# Altium schematic symbol library jlcpcb_2025_04_capacitors_extended_0603.schlib: 3668 symbols (part 12 of 20) (continued)
## CGA3E2C0G1H330JT0Y0N
designator C?  Capacitance: 33pF  (hidden comment: *)
Capacitor, Ceramic (MLCC), 33pF, ±5%, 50V, C0G, ±5%, SMD 0603; Manufacturer: TDK; Manufacturer Part Number: CGA3E2C0G1H330JT0Y0N; Package Size: 0603; JLCPCB Basic Part: No; JLCPCB Part Number: C342894; Supplier 1: LCSC; Category: Capacitors - MLCC; Supplier Part Number 1: C342894; Tolerance: ±5%; Voltage Rating: 50V; Temperature Coefficient: C0G; RoHS: Yes; ComponentLink1Description: Datasheet; ComponentLink1URL: https://wmsc.lcsc.com/wmsc/upload/file/pdf/v2/lcsc/2304140030_TDK-CGA3E2C0G1H330JT0Y0N_C342894.pdf; ComponentLink2Description: JLCPCB Part URL; ComponentLink2URL: https://jlcpcb.com/partdetail/C342894; ComponentLink3Description: LCSC Part URL; ComponentLink3URL: https://lcsc.com/product-detail/Multilayer-Ceramic-Capacitors-MLCC---SMD-SMT_TDK-TDK-CGA3E2C0G1H330JT0Y0N_C342894.html
footprint CAP-0603 (0603 (1608M) Capacitor)
pins: 1, 2

## CGA3E2C0G1H331JT0Y0N
designator C?  Capacitance: 330pF  (hidden comment: *)
Capacitor, Ceramic (MLCC), 330pF, ±5%, 50V, C0G, ±5%, SMD 0603; Manufacturer: TDK; Manufacturer Part Number: CGA3E2C0G1H331JT0Y0N; Package Size: 0603; JLCPCB Basic Part: No; JLCPCB Part Number: C338066; Supplier 1: LCSC; Category: Capacitors - MLCC; Supplier Part Number 1: C338066; Tolerance: ±5%; Voltage Rating: 50V; Temperature Coefficient: C0G; RoHS: Yes; ComponentLink1Description: Datasheet; ComponentLink1URL: https://wmsc.lcsc.com/wmsc/upload/file/pdf/v2/lcsc/2304140030_TDK-CGA3E2C0G1H331JT0Y0N_C338066.pdf; ComponentLink2Description: JLCPCB Part URL; ComponentLink2URL: https://jlcpcb.com/partdetail/C338066; ComponentLink3Description: LCSC Part URL; ComponentLink3URL: https://lcsc.com/product-detail/Multilayer-Ceramic-Capacitors-MLCC---SMD-SMT_TDK-TDK-CGA3E2C0G1H331JT0Y0N_C338066.html
footprint CAP-0603 (0603 (1608M) Capacitor)
pins: 1, 2

## CGA3E2C0G1H332JT0Y0N
designator C?  Capacitance: 3.3nF  (hidden comment: *)
Capacitor, Ceramic (MLCC), 3.3nF, ±5%, 50V, C0G, ±5%, SMD 0603; Manufacturer: TDK; Manufacturer Part Number: CGA3E2C0G1H332JT0Y0N; Package Size: 0603; JLCPCB Basic Part: No; JLCPCB Part Number: C342822; Supplier 1: LCSC; Category: Capacitors - MLCC; Supplier Part Number 1: C342822; Tolerance: ±5%; Voltage Rating: 50V; Temperature Coefficient: C0G; RoHS: Yes; ComponentLink1Description: Datasheet; ComponentLink1URL: https://wmsc.lcsc.com/wmsc/upload/file/pdf/v2/lcsc/2304140030_TDK-CGA3E2C0G1H332JT0Y0N_C342822.pdf; ComponentLink2Description: JLCPCB Part URL; ComponentLink2URL: https://jlcpcb.com/partdetail/C342822; ComponentLink3Description: LCSC Part URL; ComponentLink3URL: https://lcsc.com/product-detail/Multilayer-Ceramic-Capacitors-MLCC---SMD-SMT_TDK-TDK-CGA3E2C0G1H332JT0Y0N_C342822.html
footprint CAP-0603 (0603 (1608M) Capacitor)
pins: 1, 2

## CGA3E2C0G1H391JT0Y0N
designator C?  Capacitance: 390pF  (hidden comment: *)
Capacitor, Ceramic (MLCC), 390pF, ±5%, 50V, C0G, ±5%, SMD 0603; Manufacturer: TDK; Manufacturer Part Number: CGA3E2C0G1H391JT0Y0N; Package Size: 0603; JLCPCB Basic Part: No; JLCPCB Part Number: C342914; Supplier 1: LCSC; Category: Capacitors - MLCC; Supplier Part Number 1: C342914; Tolerance: ±5%; Voltage Rating: 50V; Temperature Coefficient: C0G; RoHS: Yes; ComponentLink1Description: Datasheet; ComponentLink1URL: https://wmsc.lcsc.com/wmsc/upload/file/pdf/v2/lcsc/2304140030_TDK-CGA3E2C0G1H391JT0Y0N_C342914.pdf; ComponentLink2Description: JLCPCB Part URL; ComponentLink2URL: https://jlcpcb.com/partdetail/C342914; ComponentLink3Description: LCSC Part URL; ComponentLink3URL: https://lcsc.com/product-detail/Multilayer-Ceramic-Capacitors-MLCC---SMD-SMT_TDK-TDK-CGA3E2C0G1H391JT0Y0N_C342914.html
footprint CAP-0603 (0603 (1608M) Capacitor)
pins: 1, 2

## CGA3E2C0G1H470JT0Y0N
designator C?  Capacitance: 47pF  (hidden comment: *)
Capacitor, Ceramic (MLCC), 47pF, ±5%, 50V, C0G, ±5%, SMD 0603; Manufacturer: TDK; Manufacturer Part Number: CGA3E2C0G1H470JT0Y0N; Package Size: 0603; JLCPCB Basic Part: No; JLCPCB Part Number: C342895; Supplier 1: LCSC; Category: Capacitors - MLCC; Supplier Part Number 1: C342895; Tolerance: ±5%; Voltage Rating: 50V; Temperature Coefficient: C0G; RoHS: Yes; ComponentLink1Description: Datasheet; ComponentLink1URL: https://wmsc.lcsc.com/wmsc/upload/file/pdf/v2/lcsc/2304140030_TDK-CGA3E2C0G1H470JT0Y0N_C342895.pdf; ComponentLink2Description: JLCPCB Part URL; ComponentLink2URL: https://jlcpcb.com/partdetail/C342895; ComponentLink3Description: LCSC Part URL; ComponentLink3URL: https://lcsc.com/product-detail/Multilayer-Ceramic-Capacitors-MLCC---SMD-SMT_TDK-TDK-CGA3E2C0G1H470JT0Y0N_C342895.html
footprint CAP-0603 (0603 (1608M) Capacitor)
pins: 1, 2

## CGA3E2C0G1H471JT0Y0N
designator C?  Capacitance: 470pF  (hidden comment: *)
Capacitor, Ceramic (MLCC), 470pF, ±5%, 50V, C0G, ±5%, SMD 0603; Manufacturer: TDK; Manufacturer Part Number: CGA3E2C0G1H471JT0Y0N; Package Size: 0603; JLCPCB Basic Part: No; JLCPCB Part Number: C342912; Supplier 1: LCSC; Category: Capacitors - MLCC; Supplier Part Number 1: C342912; Tolerance: ±5%; Voltage Rating: 50V; Temperature Coefficient: C0G; RoHS: Yes; ComponentLink1Description: Datasheet; ComponentLink1URL: https://wmsc.lcsc.com/wmsc/upload/file/pdf/v2/lcsc/2304140030_TDK-CGA3E2C0G1H471JT0Y0N_C342912.pdf; ComponentLink2Description: JLCPCB Part URL; ComponentLink2URL: https://jlcpcb.com/partdetail/C342912; ComponentLink3Description: LCSC Part URL; ComponentLink3URL: https://lcsc.com/product-detail/Multilayer-Ceramic-Capacitors-MLCC---SMD-SMT_TDK-TDK-CGA3E2C0G1H471JT0Y0N_C342912.html
footprint CAP-0603 (0603 (1608M) Capacitor)
pins: 1, 2

## CGA3E2C0G1H472JT0Y0N
designator C?  Capacitance: 4.7nF  (hidden comment: *)
Capacitor, Ceramic (MLCC), 4.7nF, ±5%, 50V, C0G, ±5%, SMD 0603; Manufacturer: TDK; Manufacturer Part Number: CGA3E2C0G1H472JT0Y0N; Package Size: 0603; JLCPCB Basic Part: No; JLCPCB Part Number: C338071; Supplier 1: LCSC; Category: Capacitors - MLCC; Supplier Part Number 1: C338071; Tolerance: ±5%; Voltage Rating: 50V; Temperature Coefficient: C0G; RoHS: Yes; ComponentLink1Description: Datasheet; ComponentLink1URL: https://wmsc.lcsc.com/wmsc/upload/file/pdf/v2/lcsc/2304140030_TDK-CGA3E2C0G1H472JT0Y0N_C338071.pdf; ComponentLink2Description: JLCPCB Part URL; ComponentLink2URL: https://jlcpcb.com/partdetail/C338071; ComponentLink3Description: LCSC Part URL; ComponentLink3URL: https://lcsc.com/product-detail/Multilayer-Ceramic-Capacitors-MLCC---SMD-SMT_TDK-TDK-CGA3E2C0G1H472JT0Y0N_C338071.html
footprint CAP-0603 (0603 (1608M) Capacitor)
pins: 1, 2

## CGA3E2C0G1H560JT0Y0N
designator C?  Capacitance: 56pF  (hidden comment: *)
Capacitor, Ceramic (MLCC), 56pF, ±5%, 50V, C0G, ±5%, SMD 0603; Manufacturer: TDK; Manufacturer Part Number: CGA3E2C0G1H560JT0Y0N; Package Size: 0603; JLCPCB Basic Part: No; JLCPCB Part Number: C338104; Supplier 1: LCSC; Category: Capacitors - MLCC; Supplier Part Number 1: C338104; Tolerance: ±5%; Voltage Rating: 50V; Temperature Coefficient: C0G; RoHS: Yes; ComponentLink1Description: Datasheet; ComponentLink1URL: https://wmsc.lcsc.com/wmsc/upload/file/pdf/v2/lcsc/2304140030_TDK-CGA3E2C0G1H560JT0Y0N_C338104.pdf; ComponentLink2Description: JLCPCB Part URL; ComponentLink2URL: https://jlcpcb.com/partdetail/C338104; ComponentLink3Description: LCSC Part URL; ComponentLink3URL: https://lcsc.com/product-detail/Multilayer-Ceramic-Capacitors-MLCC---SMD-SMT_TDK-TDK-CGA3E2C0G1H560JT0Y0N_C338104.html
footprint CAP-0603 (0603 (1608M) Capacitor)
pins: 1, 2

## CGA3E2C0G1H561JT0Y0N
designator C?  Capacitance: 560pF  (hidden comment: *)
Capacitor, Ceramic (MLCC), 560pF, ±5%, 50V, C0G, ±5%, SMD 0603; Manufacturer: TDK; Manufacturer Part Number: CGA3E2C0G1H561JT0Y0N; Package Size: 0603; JLCPCB Basic Part: No; JLCPCB Part Number: C694498; Supplier 1: LCSC; Category: Capacitors - MLCC; Supplier Part Number 1: C694498; Tolerance: ±5%; Voltage Rating: 50V; Temperature Coefficient: C0G; RoHS: Yes; ComponentLink1Description: Datasheet; ComponentLink1URL: https://wmsc.lcsc.com/wmsc/upload/file/pdf/v2/lcsc/2304140030_TDK-CGA3E2C0G1H561JT0Y0N_C694498.pdf; ComponentLink2Description: JLCPCB Part URL; ComponentLink2URL: https://jlcpcb.com/partdetail/C694498; ComponentLink3Description: LCSC Part URL; ComponentLink3URL: https://lcsc.com/product-detail/Multilayer-Ceramic-Capacitors-MLCC---SMD-SMT_TDK-TDK-CGA3E2C0G1H561JT0Y0N_C694498.html
footprint CAP-0603 (0603 (1608M) Capacitor)
pins: 1, 2

## CGA3E2C0G1H681JT0Y0N
designator C?  Capacitance: 680pF  (hidden comment: *)
Capacitor, Ceramic (MLCC), 680pF, ±5%, 50V, C0G, ±5%, SMD 0603; Manufacturer: TDK; Manufacturer Part Number: CGA3E2C0G1H681JT0Y0N; Package Size: 0603; JLCPCB Basic Part: No; JLCPCB Part Number: C342925; Supplier 1: LCSC; Category: Capacitors - MLCC; Supplier Part Number 1: C342925; Tolerance: ±5%; Voltage Rating: 50V; Temperature Coefficient: C0G; RoHS: Yes; ComponentLink1Description: Datasheet; ComponentLink1URL: https://wmsc.lcsc.com/wmsc/upload/file/pdf/v2/lcsc/2304140030_TDK-CGA3E2C0G1H681JT0Y0N_C342925.pdf; ComponentLink2Description: JLCPCB Part URL; ComponentLink2URL: https://jlcpcb.com/partdetail/C342925; ComponentLink3Description: LCSC Part URL; ComponentLink3URL: https://lcsc.com/product-detail/Multilayer-Ceramic-Capacitors-MLCC---SMD-SMT_TDK-TDK-CGA3E2C0G1H681JT0Y0N_C342925.html
footprint CAP-0603 (0603 (1608M) Capacitor)
pins: 1, 2

## CGA3E2C0G1H682JT0Y0N
designator C?  Capacitance: 6.8nF  (hidden comment: *)
Capacitor, Ceramic (MLCC), 6.8nF, ±5%, 50V, C0G, ±5%, SMD 0603; Manufacturer: TDK; Manufacturer Part Number: CGA3E2C0G1H682JT0Y0N; Package Size: 0603; JLCPCB Basic Part: No; JLCPCB Part Number: C2835383; Supplier 1: LCSC; Category: Capacitors - MLCC; Supplier Part Number 1: C2835383; Tolerance: ±5%; Voltage Rating: 50V; Temperature Coefficient: C0G; RoHS: Yes; ComponentLink1Description: Datasheet; ComponentLink1URL: https://wmsc.lcsc.com/wmsc/upload/file/pdf/v2/lcsc/2108160930_TDK-CGA3E2C0G1H682JT0Y0N_C2835383.pdf; ComponentLink2Description: JLCPCB Part URL; ComponentLink2URL: https://jlcpcb.com/partdetail/C2835383; ComponentLink3Description: LCSC Part URL; ComponentLink3URL: https://lcsc.com/product-detail/Multilayer-Ceramic-Capacitors-MLCC---SMD-SMT_TDK-TDK-CGA3E2C0G1H682JT0Y0N_C2835383.html
footprint CAP-0603 (0603 (1608M) Capacitor)
pins: 1, 2

## CGA3E2C0G1H820JT0Y0N
designator C?  Capacitance: 82pF  (hidden comment: *)
Capacitor, Ceramic (MLCC), 82pF, ±5%, 50V, C0G, ±5%, SMD 0603; Manufacturer: TDK; Manufacturer Part Number: CGA3E2C0G1H820JT0Y0N; Package Size: 0603; JLCPCB Basic Part: No; JLCPCB Part Number: C695383; Supplier 1: LCSC; Category: Capacitors - MLCC; Supplier Part Number 1: C695383; Tolerance: ±5%; Voltage Rating: 50V; Temperature Coefficient: C0G; RoHS: Yes; ComponentLink1Description: Datasheet; ComponentLink1URL: https://wmsc.lcsc.com/wmsc/upload/file/pdf/v2/lcsc/2304140030_TDK-CGA3E2C0G1H820JT0Y0N_C695383.pdf; ComponentLink2Description: JLCPCB Part URL; ComponentLink2URL: https://jlcpcb.com/partdetail/C695383; ComponentLink3Description: LCSC Part URL; ComponentLink3URL: https://lcsc.com/product-detail/Multilayer-Ceramic-Capacitors-MLCC---SMD-SMT_TDK-TDK-CGA3E2C0G1H820JT0Y0N_C695383.html
footprint CAP-0603 (0603 (1608M) Capacitor)
pins: 1, 2

## CGA3E2C0G1H821JT0Y0N
designator C?  Capacitance: 820pF  (hidden comment: *)
Capacitor, Ceramic (MLCC), 820pF, ±5%, 50V, C0G, ±5%, SMD 0603; Manufacturer: TDK; Manufacturer Part Number: CGA3E2C0G1H821JT0Y0N; Package Size: 0603; JLCPCB Basic Part: No; JLCPCB Part Number: C694499; Supplier 1: LCSC; Category: Capacitors - MLCC; Supplier Part Number 1: C694499; Tolerance: ±5%; Voltage Rating: 50V; Temperature Coefficient: C0G; RoHS: Yes; ComponentLink1Description: Datasheet; ComponentLink1URL: https://wmsc.lcsc.com/wmsc/upload/file/pdf/v2/lcsc/2304140030_TDK-CGA3E2C0G1H821JT0Y0N_C694499.pdf; ComponentLink2Description: JLCPCB Part URL; ComponentLink2URL: https://jlcpcb.com/partdetail/C694499; ComponentLink3Description: LCSC Part URL; ComponentLink3URL: https://lcsc.com/product-detail/Multilayer-Ceramic-Capacitors-MLCC---SMD-SMT_TDK-TDK-CGA3E2C0G1H821JT0Y0N_C694499.html
footprint CAP-0603 (0603 (1608M) Capacitor)
pins: 1, 2

## CGA3E2C0G2A100DT0Y0N
designator C?  Capacitance: 10pF  (hidden comment: *)
Capacitor, Ceramic (MLCC), 10pF, 100V, C0G, SMD 0603; Manufacturer: TDK; Manufacturer Part Number: CGA3E2C0G2A100DT0Y0N; Package Size: 0603; JLCPCB Basic Part: No; JLCPCB Part Number: C342921; Supplier 1: LCSC; Category: Capacitors - MLCC; Supplier Part Number 1: C342921; Voltage Rating: 100V; Temperature Coefficient: C0G; RoHS: Yes; ComponentLink1Description: Datasheet; ComponentLink1URL: https://wmsc.lcsc.com/wmsc/upload/file/pdf/v2/lcsc/2304140030_TDK-CGA3E2C0G2A100DT0Y0N_C342921.pdf; ComponentLink2Description: JLCPCB Part URL; ComponentLink2URL: https://jlcpcb.com/partdetail/C342921; ComponentLink3Description: LCSC Part URL; ComponentLink3URL: https://lcsc.com/product-detail/Multilayer-Ceramic-Capacitors-MLCC---SMD-SMT_TDK-TDK-CGA3E2C0G2A100DT0Y0N_C342921.html
footprint CAP-0603 (0603 (1608M) Capacitor)
pins: 1, 2

## CGA3E2C0G2A101JT0Y0N
designator C?  Capacitance: 100pF  (hidden comment: *)
Capacitor, Ceramic (MLCC), 100pF, ±5%, 100V, C0G, ±5%, SMD 0603; Manufacturer: TDK; Manufacturer Part Number: CGA3E2C0G2A101JT0Y0N; Package Size: 0603; JLCPCB Basic Part: No; JLCPCB Part Number: C342908; Supplier 1: LCSC; Category: Capacitors - MLCC; Supplier Part Number 1: C342908; Tolerance: ±5%; Voltage Rating: 100V; Temperature Coefficient: C0G; RoHS: Yes; ComponentLink1Description: Datasheet; ComponentLink1URL: https://wmsc.lcsc.com/wmsc/upload/file/pdf/v2/lcsc/2304140030_TDK-CGA3E2C0G2A101JT0Y0N_C342908.pdf; ComponentLink2Description: JLCPCB Part URL; ComponentLink2URL: https://jlcpcb.com/partdetail/C342908; ComponentLink3Description: LCSC Part URL; ComponentLink3URL: https://lcsc.com/product-detail/Multilayer-Ceramic-Capacitors-MLCC---SMD-SMT_TDK-TDK-CGA3E2C0G2A101JT0Y0N_C342908.html
footprint CAP-0603 (0603 (1608M) Capacitor)
pins: 1, 2

## CGA3E2C0G2A102JT0Y0N
designator C?  Capacitance: 1nF  (hidden comment: *)
Capacitor, Ceramic (MLCC), 1nF, ±5%, 100V, C0G, ±5%, SMD 0603; Manufacturer: TDK; Manufacturer Part Number: CGA3E2C0G2A102JT0Y0N; Package Size: 0603; JLCPCB Basic Part: No; JLCPCB Part Number: C342928; Supplier 1: LCSC; Category: Capacitors - MLCC; Supplier Part Number 1: C342928; Tolerance: ±5%; Voltage Rating: 100V; Temperature Coefficient: C0G; RoHS: Yes; ComponentLink1Description: Datasheet; ComponentLink1URL: https://wmsc.lcsc.com/wmsc/upload/file/pdf/v2/lcsc/2304140030_TDK-CGA3E2C0G2A102JT0Y0N_C342928.pdf; ComponentLink2Description: JLCPCB Part URL; ComponentLink2URL: https://jlcpcb.com/partdetail/C342928; ComponentLink3Description: LCSC Part URL; ComponentLink3URL: https://lcsc.com/product-detail/Multilayer-Ceramic-Capacitors-MLCC---SMD-SMT_TDK-TDK-CGA3E2C0G2A102JT0Y0N_C342928.html
footprint CAP-0603 (0603 (1608M) Capacitor)
pins: 1, 2

## CGA3E2C0G2A122JT0Y0N
designator C?  Capacitance: 1.2nF  (hidden comment: *)
Capacitor, Ceramic (MLCC), 1.2nF, ±5%, 100V, C0G, ±5%, SMD 0603; Manufacturer: TDK; Manufacturer Part Number: CGA3E2C0G2A122JT0Y0N; Package Size: 0603; JLCPCB Basic Part: No; JLCPCB Part Number: C342931; Supplier 1: LCSC; Category: Capacitors - MLCC; Supplier Part Number 1: C342931; Tolerance: ±5%; Voltage Rating: 100V; Temperature Coefficient: C0G; RoHS: Yes; ComponentLink1Description: Datasheet; ComponentLink1URL: https://wmsc.lcsc.com/wmsc/upload/file/pdf/v2/lcsc/2304140030_TDK-CGA3E2C0G2A122JT0Y0N_C342931.pdf; ComponentLink2Description: JLCPCB Part URL; ComponentLink2URL: https://jlcpcb.com/partdetail/C342931; ComponentLink3Description: LCSC Part URL; ComponentLink3URL: https://lcsc.com/product-detail/Multilayer-Ceramic-Capacitors-MLCC---SMD-SMT_TDK-TDK-CGA3E2C0G2A122JT0Y0N_C342931.html
footprint CAP-0603 (0603 (1608M) Capacitor)
pins: 1, 2

## CGA3E2C0G2A151JT0Y0N
designator C?  Capacitance: 150pF  (hidden comment: *)
Capacitor, Ceramic (MLCC), 150pF, ±5%, 100V, C0G, ±5%, SMD 0603; Manufacturer: TDK; Manufacturer Part Number: CGA3E2C0G2A151JT0Y0N; Package Size: 0603; JLCPCB Basic Part: No; JLCPCB Part Number: C694222; Supplier 1: LCSC; Category: Capacitors - MLCC; Supplier Part Number 1: C694222; Tolerance: ±5%; Voltage Rating: 100V; Temperature Coefficient: C0G; RoHS: Yes; ComponentLink1Description: Datasheet; ComponentLink1URL: https://wmsc.lcsc.com/wmsc/upload/file/pdf/v2/lcsc/2304140030_TDK-CGA3E2C0G2A151JT0Y0N_C694222.pdf; ComponentLink2Description: JLCPCB Part URL; ComponentLink2URL: https://jlcpcb.com/partdetail/C694222; ComponentLink3Description: LCSC Part URL; ComponentLink3URL: https://lcsc.com/product-detail/Multilayer-Ceramic-Capacitors-MLCC---SMD-SMT_TDK-TDK-CGA3E2C0G2A151JT0Y0N_C694222.html
footprint CAP-0603 (0603 (1608M) Capacitor)
pins: 1, 2

## CGA3E2C0G2A221JT0Y0N
designator C?  Capacitance: 220pF  (hidden comment: *)
Capacitor, Ceramic (MLCC), 220pF, ±5%, 100V, C0G, ±5%, SMD 0603; Manufacturer: TDK; Manufacturer Part Number: CGA3E2C0G2A221JT0Y0N; Package Size: 0603; JLCPCB Basic Part: No; JLCPCB Part Number: C342920; Supplier 1: LCSC; Category: Capacitors - MLCC; Supplier Part Number 1: C342920; Tolerance: ±5%; Voltage Rating: 100V; Temperature Coefficient: C0G; RoHS: Yes; ComponentLink1Description: Datasheet; ComponentLink1URL: https://wmsc.lcsc.com/wmsc/upload/file/pdf/v2/lcsc/2304140030_TDK-CGA3E2C0G2A221JT0Y0N_C342920.pdf; ComponentLink2Description: JLCPCB Part URL; ComponentLink2URL: https://jlcpcb.com/partdetail/C342920; ComponentLink3Description: LCSC Part URL; ComponentLink3URL: https://lcsc.com/product-detail/Multilayer-Ceramic-Capacitors-MLCC---SMD-SMT_TDK-TDK-CGA3E2C0G2A221JT0Y0N_C342920.html
footprint CAP-0603 (0603 (1608M) Capacitor)
pins: 1, 2

## CGA3E2C0G2A270JT0Y0N
designator C?  Capacitance: 27pF  (hidden comment: *)
Capacitor, Ceramic (MLCC), 27pF, ±5%, 100V, C0G, ±5%, SMD 0603; Manufacturer: TDK; Manufacturer Part Number: CGA3E2C0G2A270JT0Y0N; Package Size: 0603; JLCPCB Basic Part: No; JLCPCB Part Number: C338092; Supplier 1: LCSC; Category: Capacitors - MLCC; Supplier Part Number 1: C338092; Tolerance: ±5%; Voltage Rating: 100V; Temperature Coefficient: C0G; RoHS: Yes; ComponentLink1Description: Datasheet; ComponentLink1URL: https://wmsc.lcsc.com/wmsc/upload/file/pdf/v2/lcsc/2304140030_TDK-CGA3E2C0G2A270JT0Y0N_C338092.pdf; ComponentLink2Description: JLCPCB Part URL; ComponentLink2URL: https://jlcpcb.com/partdetail/C338092; ComponentLink3Description: LCSC Part URL; ComponentLink3URL: https://lcsc.com/product-detail/Multilayer-Ceramic-Capacitors-MLCC---SMD-SMT_TDK-TDK-CGA3E2C0G2A270JT0Y0N_C338092.html
footprint CAP-0603 (0603 (1608M) Capacitor)
pins: 1, 2

## CGA3E2C0G2A330JT0Y0N
designator C?  Capacitance: 33pF  (hidden comment: *)
Capacitor, Ceramic (MLCC), 33pF, ±5%, 100V, C0G, ±5%, SMD 0603; Manufacturer: TDK; Manufacturer Part Number: CGA3E2C0G2A330JT0Y0N; Package Size: 0603; JLCPCB Basic Part: No; JLCPCB Part Number: C338069; Supplier 1: LCSC; Category: Capacitors - MLCC; Supplier Part Number 1: C338069; Tolerance: ±5%; Voltage Rating: 100V; Temperature Coefficient: C0G; RoHS: Yes; ComponentLink1Description: Datasheet; ComponentLink1URL: https://wmsc.lcsc.com/wmsc/upload/file/pdf/v2/lcsc/2304140030_TDK-CGA3E2C0G2A330JT0Y0N_C338069.pdf; ComponentLink2Description: JLCPCB Part URL; ComponentLink2URL: https://jlcpcb.com/partdetail/C338069; ComponentLink3Description: LCSC Part URL; ComponentLink3URL: https://lcsc.com/product-detail/Multilayer-Ceramic-Capacitors-MLCC---SMD-SMT_TDK-TDK-CGA3E2C0G2A330JT0Y0N_C338069.html
footprint CAP-0603 (0603 (1608M) Capacitor)
pins: 1, 2

## CGA3E2C0G2A331JT0Y0N
designator C?  Capacitance: 330pF  (hidden comment: *)
Capacitor, Ceramic (MLCC), 330pF, ±5%, 100V, C0G, ±5%, SMD 0603; Manufacturer: TDK; Manufacturer Part Number: CGA3E2C0G2A331JT0Y0N; Package Size: 0603; JLCPCB Basic Part: No; JLCPCB Part Number: C694223; Supplier 1: LCSC; Category: Capacitors - MLCC; Supplier Part Number 1: C694223; Tolerance: ±5%; Voltage Rating: 100V; Temperature Coefficient: C0G; RoHS: Yes; ComponentLink1Description: Datasheet; ComponentLink1URL: https://wmsc.lcsc.com/wmsc/upload/file/pdf/v2/lcsc/2304140030_TDK-CGA3E2C0G2A331JT0Y0N_C694223.pdf; ComponentLink2Description: JLCPCB Part URL; ComponentLink2URL: https://jlcpcb.com/partdetail/C694223; ComponentLink3Description: LCSC Part URL; ComponentLink3URL: https://lcsc.com/product-detail/Multilayer-Ceramic-Capacitors-MLCC---SMD-SMT_TDK-TDK-CGA3E2C0G2A331JT0Y0N_C694223.html
footprint CAP-0603 (0603 (1608M) Capacitor)
pins: 1, 2

## CGA3E2C0G2A470JT0Y0N
designator C?  Capacitance: 47pF  (hidden comment: *)
Capacitor, Ceramic (MLCC), 47pF, ±5%, 100V, C0G, ±5%, SMD 0603; Manufacturer: TDK; Manufacturer Part Number: CGA3E2C0G2A470JT0Y0N; Package Size: 0603; JLCPCB Basic Part: No; JLCPCB Part Number: C342922; Supplier 1: LCSC; Category: Capacitors - MLCC; Supplier Part Number 1: C342922; Tolerance: ±5%; Voltage Rating: 100V; Temperature Coefficient: C0G; RoHS: Yes; ComponentLink1Description: Datasheet; ComponentLink1URL: https://wmsc.lcsc.com/wmsc/upload/file/pdf/v2/lcsc/2304140030_TDK-CGA3E2C0G2A470JT0Y0N_C342922.pdf; ComponentLink2Description: JLCPCB Part URL; ComponentLink2URL: https://jlcpcb.com/partdetail/C342922; ComponentLink3Description: LCSC Part URL; ComponentLink3URL: https://lcsc.com/product-detail/Multilayer-Ceramic-Capacitors-MLCC---SMD-SMT_TDK-TDK-CGA3E2C0G2A470JT0Y0N_C342922.html
footprint CAP-0603 (0603 (1608M) Capacitor)
pins: 1, 2

## CGA3E2C0G2A471JT0Y0N
designator C?  Capacitance: 470pF  (hidden comment: *)
Capacitor, Ceramic (MLCC), 470pF, ±5%, 100V, C0G, ±5%, SMD 0603; Manufacturer: TDK; Manufacturer Part Number: CGA3E2C0G2A471JT0Y0N; Package Size: 0603; JLCPCB Basic Part: No; JLCPCB Part Number: C342926; Supplier 1: LCSC; Category: Capacitors - MLCC; Supplier Part Number 1: C342926; Tolerance: ±5%; Voltage Rating: 100V; Temperature Coefficient: C0G; RoHS: Yes; ComponentLink1Description: Datasheet; ComponentLink1URL: https://wmsc.lcsc.com/wmsc/upload/file/pdf/v2/lcsc/2304140030_TDK-CGA3E2C0G2A471JT0Y0N_C342926.pdf; ComponentLink2Description: JLCPCB Part URL; ComponentLink2URL: https://jlcpcb.com/partdetail/C342926; ComponentLink3Description: LCSC Part URL; ComponentLink3URL: https://lcsc.com/product-detail/Multilayer-Ceramic-Capacitors-MLCC---SMD-SMT_TDK-TDK-CGA3E2C0G2A471JT0Y0N_C342926.html
footprint CAP-0603 (0603 (1608M) Capacitor)
pins: 1, 2

## CGA3E2C0G2A680JT0Y0N
designator C?  Capacitance: 68pF  (hidden comment: *)
Capacitor, Ceramic (MLCC), 68pF, ±5%, 100V, C0G, ±5%, SMD 0603; Manufacturer: TDK; Manufacturer Part Number: CGA3E2C0G2A680JT0Y0N; Package Size: 0603; JLCPCB Basic Part: No; JLCPCB Part Number: C694224; Supplier 1: LCSC; Category: Capacitors - MLCC; Supplier Part Number 1: C694224; Tolerance: ±5%; Voltage Rating: 100V; Temperature Coefficient: C0G; RoHS: Yes; ComponentLink1Description: Datasheet; ComponentLink1URL: https://wmsc.lcsc.com/wmsc/upload/file/pdf/v2/lcsc/2304140030_TDK-CGA3E2C0G2A680JT0Y0N_C694224.pdf; ComponentLink2Description: JLCPCB Part URL; ComponentLink2URL: https://jlcpcb.com/partdetail/C694224; ComponentLink3Description: LCSC Part URL; ComponentLink3URL: https://lcsc.com/product-detail/Multilayer-Ceramic-Capacitors-MLCC---SMD-SMT_TDK-TDK-CGA3E2C0G2A680JT0Y0N_C694224.html
footprint CAP-0603 (0603 (1608M) Capacitor)
pins: 1, 2

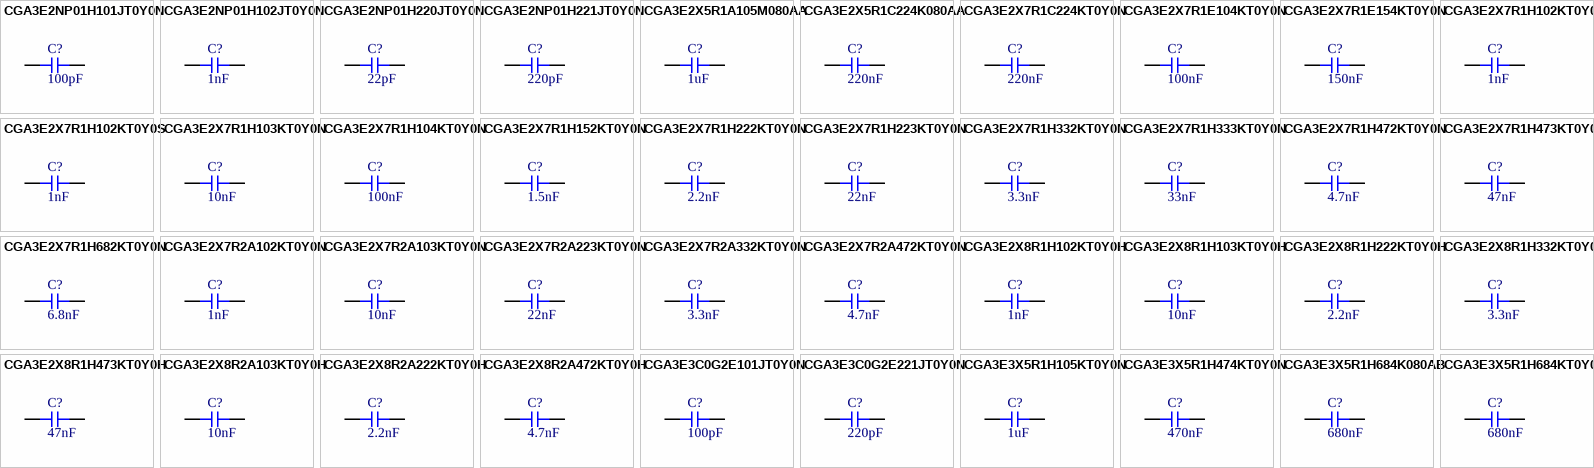
[diagram p53: symbols CGA3E2NP01H101JT0Y0N to CGA3E3X5R1H684KT0Y0N]

## CGA3E2NP01H101JT0Y0N
designator C?  Capacitance: 100pF  (hidden comment: *)
Capacitor, Ceramic (MLCC), 100pF, ±5%, 50V, NP0, ±5%, SMD 0603; Manufacturer: TDK; Manufacturer Part Number: CGA3E2NP01H101JT0Y0N; Package Size: 0603; JLCPCB Basic Part: No; JLCPCB Part Number: C695384; Supplier 1: LCSC; Category: Capacitors - MLCC; Supplier Part Number 1: C695384; Tolerance: ±5%; Voltage Rating: 50V; Temperature Coefficient: NP0; RoHS: Yes; ComponentLink1Description: Datasheet; ComponentLink1URL: https://wmsc.lcsc.com/wmsc/upload/file/pdf/v2/lcsc/2304140030_TDK-CGA3E2NP01H101JT0Y0N_C695384.pdf; ComponentLink2Description: JLCPCB Part URL; ComponentLink2URL: https://jlcpcb.com/partdetail/C695384; ComponentLink3Description: LCSC Part URL; ComponentLink3URL: https://lcsc.com/product-detail/Multilayer-Ceramic-Capacitors-MLCC---SMD-SMT_TDK-TDK-CGA3E2NP01H101JT0Y0N_C695384.html
footprint CAP-0603 (0603 (1608M) Capacitor)
pins: 1, 2

## CGA3E2NP01H102JT0Y0N
designator C?  Capacitance: 1nF  (hidden comment: *)
Capacitor, Ceramic (MLCC), 1nF, ±5%, 50V, NP0, ±5%, SMD 0603; Manufacturer: TDK; Manufacturer Part Number: CGA3E2NP01H102JT0Y0N; Package Size: 0603; JLCPCB Basic Part: No; JLCPCB Part Number: C694500; Supplier 1: LCSC; Category: Capacitors - MLCC; Supplier Part Number 1: C694500; Tolerance: ±5%; Voltage Rating: 50V; Temperature Coefficient: NP0; RoHS: Yes; ComponentLink1Description: Datasheet; ComponentLink1URL: https://wmsc.lcsc.com/wmsc/upload/file/pdf/v2/lcsc/2010221134_TDK-CGA3E2NP01H102JT0Y0N_C694500.pdf; ComponentLink2Description: JLCPCB Part URL; ComponentLink2URL: https://jlcpcb.com/partdetail/C694500; ComponentLink3Description: LCSC Part URL; ComponentLink3URL: https://lcsc.com/product-detail/Multilayer-Ceramic-Capacitors-MLCC---SMD-SMT_TDK-TDK-CGA3E2NP01H102JT0Y0N_C694500.html
footprint CAP-0603 (0603 (1608M) Capacitor)
pins: 1, 2

## CGA3E2NP01H220JT0Y0N
designator C?  Capacitance: 22pF  (hidden comment: *)
Capacitor, Ceramic (MLCC), 22pF, ±5%, 50V, NP0, ±5%, SMD 0603; Manufacturer: TDK; Manufacturer Part Number: CGA3E2NP01H220JT0Y0N; Package Size: 0603; JLCPCB Basic Part: No; JLCPCB Part Number: C695385; Supplier 1: LCSC; Category: Capacitors - MLCC; Supplier Part Number 1: C695385; Tolerance: ±5%; Voltage Rating: 50V; Temperature Coefficient: NP0; RoHS: Yes; ComponentLink1Description: Datasheet; ComponentLink1URL: https://wmsc.lcsc.com/wmsc/upload/file/pdf/v2/lcsc/2304140030_TDK-CGA3E2NP01H220JT0Y0N_C695385.pdf; ComponentLink2Description: JLCPCB Part URL; ComponentLink2URL: https://jlcpcb.com/partdetail/C695385; ComponentLink3Description: LCSC Part URL; ComponentLink3URL: https://lcsc.com/product-detail/Multilayer-Ceramic-Capacitors-MLCC---SMD-SMT_TDK-TDK-CGA3E2NP01H220JT0Y0N_C695385.html
footprint CAP-0603 (0603 (1608M) Capacitor)
pins: 1, 2

## CGA3E2NP01H221JT0Y0N
designator C?  Capacitance: 220pF  (hidden comment: *)
Capacitor, Ceramic (MLCC), 220pF, ±5%, 50V, NP0, ±5%, SMD 0603; Manufacturer: TDK; Manufacturer Part Number: CGA3E2NP01H221JT0Y0N; Package Size: 0603; JLCPCB Basic Part: No; JLCPCB Part Number: C694226; Supplier 1: LCSC; Category: Capacitors - MLCC; Supplier Part Number 1: C694226; Tolerance: ±5%; Voltage Rating: 50V; Temperature Coefficient: NP0; RoHS: Yes; ComponentLink1Description: Datasheet; ComponentLink1URL: https://wmsc.lcsc.com/wmsc/upload/file/pdf/v2/lcsc/2304140030_TDK-CGA3E2NP01H221JT0Y0N_C694226.pdf; ComponentLink2Description: JLCPCB Part URL; ComponentLink2URL: https://jlcpcb.com/partdetail/C694226; ComponentLink3Description: LCSC Part URL; ComponentLink3URL: https://lcsc.com/product-detail/Multilayer-Ceramic-Capacitors-MLCC---SMD-SMT_TDK-TDK-CGA3E2NP01H221JT0Y0N_C694226.html
footprint CAP-0603 (0603 (1608M) Capacitor)
pins: 1, 2

## CGA3E2X5R1A105M080AA
designator C?  Capacitance: 1uF  (hidden comment: *)
Capacitor, Ceramic (MLCC), 1uF, ±20%, 10V, X5R, ±20%, SMD 0603; Manufacturer: TDK; Manufacturer Part Number: CGA3E2X5R1A105M080AA; Package Size: 0603; JLCPCB Basic Part: No; JLCPCB Part Number: C193122; Supplier 1: LCSC; Category: Capacitors - MLCC; Supplier Part Number 1: C193122; Tolerance: ±20%; Voltage Rating: 10V; Temperature Coefficient: X5R; RoHS: Yes; ComponentLink1Description: Datasheet; ComponentLink1URL: https://wmsc.lcsc.com/wmsc/upload/file/pdf/v2/lcsc/2304140030_TDK-CGA3E2X5R1A105M080AA_C193122.pdf; ComponentLink2Description: JLCPCB Part URL; ComponentLink2URL: https://jlcpcb.com/partdetail/C193122; ComponentLink3Description: LCSC Part URL; ComponentLink3URL: https://lcsc.com/product-detail/Multilayer-Ceramic-Capacitors-MLCC---SMD-SMT_TDK-TDK-CGA3E2X5R1A105M080AA_C193122.html
footprint CAP-0603 (0603 (1608M) Capacitor)
pins: 1, 2

## CGA3E2X5R1C224K080AA
designator C?  Capacitance: 220nF  (hidden comment: *)
Capacitor, Ceramic (MLCC), 220nF, ±10%, 16V, X5R, ±10%, SMD 0603; Manufacturer: TDK; Manufacturer Part Number: CGA3E2X5R1C224K080AA; Package Size: 0603; JLCPCB Basic Part: No; JLCPCB Part Number: C193098; Supplier 1: LCSC; Category: Capacitors - MLCC; Supplier Part Number 1: C193098; Tolerance: ±10%; Voltage Rating: 16V; Temperature Coefficient: X5R; RoHS: Yes; ComponentLink1Description: Datasheet; ComponentLink1URL: https://wmsc.lcsc.com/wmsc/upload/file/pdf/v2/lcsc/2304140030_TDK-CGA3E2X5R1C224K080AA_C193098.pdf; ComponentLink2Description: JLCPCB Part URL; ComponentLink2URL: https://jlcpcb.com/partdetail/C193098; ComponentLink3Description: LCSC Part URL; ComponentLink3URL: https://lcsc.com/product-detail/Multilayer-Ceramic-Capacitors-MLCC---SMD-SMT_TDK-TDK-CGA3E2X5R1C224K080AA_C193098.html
footprint CAP-0603 (0603 (1608M) Capacitor)
pins: 1, 2

## CGA3E2X7R1C224KT0Y0N
designator C?  Capacitance: 220nF  (hidden comment: *)
Capacitor, Ceramic (MLCC), 220nF, ±10%, 16V, X7R, ±10%, SMD 0603; Manufacturer: TDK; Manufacturer Part Number: CGA3E2X7R1C224KT0Y0N; Package Size: 0603; JLCPCB Basic Part: No; JLCPCB Part Number: C342913; Supplier 1: LCSC; Category: Capacitors - MLCC; Supplier Part Number 1: C342913; Tolerance: ±10%; Voltage Rating: 16V; Temperature Coefficient: X7R; RoHS: Yes; ComponentLink1Description: Datasheet; ComponentLink1URL: https://wmsc.lcsc.com/wmsc/upload/file/pdf/v2/lcsc/2304140030_TDK-CGA3E2X7R1C224KT0Y0N_C342913.pdf; ComponentLink2Description: JLCPCB Part URL; ComponentLink2URL: https://jlcpcb.com/partdetail/C342913; ComponentLink3Description: LCSC Part URL; ComponentLink3URL: https://lcsc.com/product-detail/Multilayer-Ceramic-Capacitors-MLCC---SMD-SMT_TDK-TDK-CGA3E2X7R1C224KT0Y0N_C342913.html
footprint CAP-0603 (0603 (1608M) Capacitor)
pins: 1, 2

## CGA3E2X7R1E104KT0Y0N
designator C?  Capacitance: 100nF  (hidden comment: *)
Capacitor, Ceramic (MLCC), 100nF, ±10%, 25V, X7R, ±10%, SMD 0603; Manufacturer: TDK; Manufacturer Part Number: CGA3E2X7R1E104KT0Y0N; Package Size: 0603; JLCPCB Basic Part: No; JLCPCB Part Number: C338117; Supplier 1: LCSC; Category: Capacitors - MLCC; Supplier Part Number 1: C338117; Tolerance: ±10%; Voltage Rating: 25V; Temperature Coefficient: X7R; RoHS: Yes; ComponentLink1Description: Datasheet; ComponentLink1URL: https://wmsc.lcsc.com/wmsc/upload/file/pdf/v2/lcsc/2304140030_TDK-CGA3E2X7R1E104KT0Y0N_C338117.pdf; ComponentLink2Description: JLCPCB Part URL; ComponentLink2URL: https://jlcpcb.com/partdetail/C338117; ComponentLink3Description: LCSC Part URL; ComponentLink3URL: https://lcsc.com/product-detail/Multilayer-Ceramic-Capacitors-MLCC---SMD-SMT_TDK-TDK-CGA3E2X7R1E104KT0Y0N_C338117.html
footprint CAP-0603 (0603 (1608M) Capacitor)
pins: 1, 2

## CGA3E2X7R1E154KT0Y0N
designator C?  Capacitance: 150nF  (hidden comment: *)
Capacitor, Ceramic (MLCC), 150nF, ±10%, 25V, X7R, ±10%, SMD 0603; Manufacturer: TDK; Manufacturer Part Number: CGA3E2X7R1E154KT0Y0N; Package Size: 0603; JLCPCB Basic Part: No; JLCPCB Part Number: C694501; Supplier 1: LCSC; Category: Capacitors - MLCC; Supplier Part Number 1: C694501; Tolerance: ±10%; Voltage Rating: 25V; Temperature Coefficient: X7R; RoHS: Yes; ComponentLink1Description: Datasheet; ComponentLink1URL: https://wmsc.lcsc.com/wmsc/upload/file/pdf/v2/lcsc/2208091530_TDK-CGA3E2X7R1E154KT0Y0N_C694501.pdf; ComponentLink2Description: JLCPCB Part URL; ComponentLink2URL: https://jlcpcb.com/partdetail/C694501; ComponentLink3Description: LCSC Part URL; ComponentLink3URL: https://lcsc.com/product-detail/Multilayer-Ceramic-Capacitors-MLCC---SMD-SMT_TDK-TDK-CGA3E2X7R1E154KT0Y0N_C694501.html
footprint CAP-0603 (0603 (1608M) Capacitor)
pins: 1, 2

## CGA3E2X7R1H102KT0Y0N
designator C?  Capacitance: 1nF  (hidden comment: *)
Capacitor, Ceramic (MLCC), 1nF, ±10%, 50V, X7R, ±10%, SMD 0603; Manufacturer: TDK; Manufacturer Part Number: CGA3E2X7R1H102KT0Y0N; Package Size: 0603; JLCPCB Basic Part: No; JLCPCB Part Number: C342900; Supplier 1: LCSC; Category: Capacitors - MLCC; Supplier Part Number 1: C342900; Tolerance: ±10%; Voltage Rating: 50V; Temperature Coefficient: X7R; RoHS: Yes; ComponentLink1Description: Datasheet; ComponentLink1URL: https://wmsc.lcsc.com/wmsc/upload/file/pdf/v2/lcsc/2304140030_TDK-CGA3E2X7R1H102KT0Y0N_C342900.pdf; ComponentLink2Description: JLCPCB Part URL; ComponentLink2URL: https://jlcpcb.com/partdetail/C342900; ComponentLink3Description: LCSC Part URL; ComponentLink3URL: https://lcsc.com/product-detail/Multilayer-Ceramic-Capacitors-MLCC---SMD-SMT_TDK-TDK-CGA3E2X7R1H102KT0Y0N_C342900.html
footprint CAP-0603 (0603 (1608M) Capacitor)
pins: 1, 2

## CGA3E2X7R1H102KT0Y0S
designator C?  Capacitance: 1nF  (hidden comment: *)
Capacitor, Ceramic (MLCC), 1nF, ±10%, 50V, X7R, ±10%, SMD 0603; Manufacturer: TDK; Manufacturer Part Number: CGA3E2X7R1H102KT0Y0S; Package Size: 0603; JLCPCB Basic Part: No; JLCPCB Part Number: C432941; Supplier 1: LCSC; Category: Capacitors - MLCC; Supplier Part Number 1: C432941; Tolerance: ±10%; Voltage Rating: 50V; Temperature Coefficient: X7R; RoHS: Yes; ComponentLink1Description: Datasheet; ComponentLink1URL: https://wmsc.lcsc.com/wmsc/upload/file/pdf/v2/lcsc/2304140030_TDK-CGA3E2X7R1H102KT0Y0S_C432941.pdf; ComponentLink2Description: JLCPCB Part URL; ComponentLink2URL: https://jlcpcb.com/partdetail/C432941; ComponentLink3Description: LCSC Part URL; ComponentLink3URL: https://lcsc.com/product-detail/Multilayer-Ceramic-Capacitors-MLCC---SMD-SMT_TDK-TDK-CGA3E2X7R1H102KT0Y0S_C432941.html
footprint CAP-0603 (0603 (1608M) Capacitor)
pins: 1, 2

## CGA3E2X7R1H103KT0Y0N
designator C?  Capacitance: 10nF  (hidden comment: *)
Capacitor, Ceramic (MLCC), 10nF, ±10%, 50V, X7R, ±10%, SMD 0603; Manufacturer: TDK; Manufacturer Part Number: CGA3E2X7R1H103KT0Y0N; Package Size: 0603; JLCPCB Basic Part: No; JLCPCB Part Number: C342901; Supplier 1: LCSC; Category: Capacitors - MLCC; Supplier Part Number 1: C342901; Tolerance: ±10%; Voltage Rating: 50V; Temperature Coefficient: X7R; RoHS: Yes; ComponentLink1Description: Datasheet; ComponentLink1URL: https://wmsc.lcsc.com/wmsc/upload/file/pdf/v2/lcsc/2304140030_TDK-CGA3E2X7R1H103KT0Y0N_C342901.pdf; ComponentLink2Description: JLCPCB Part URL; ComponentLink2URL: https://jlcpcb.com/partdetail/C342901; ComponentLink3Description: LCSC Part URL; ComponentLink3URL: https://lcsc.com/product-detail/Multilayer-Ceramic-Capacitors-MLCC---SMD-SMT_TDK-TDK-CGA3E2X7R1H103KT0Y0N_C342901.html
footprint CAP-0603 (0603 (1608M) Capacitor)
pins: 1, 2

## CGA3E2X7R1H104KT0Y0N
designator C?  Capacitance: 100nF  (hidden comment: *)
Capacitor, Ceramic (MLCC), 100nF, ±10%, 50V, X7R, ±10%, SMD 0603; Manufacturer: TDK; Manufacturer Part Number: CGA3E2X7R1H104KT0Y0N; Package Size: 0603; JLCPCB Basic Part: No; JLCPCB Part Number: C76711; Supplier 1: LCSC; Category: Capacitors - MLCC; Supplier Part Number 1: C76711; Tolerance: ±10%; Voltage Rating: 50V; Temperature Coefficient: X7R; RoHS: Yes; ComponentLink1Description: Datasheet; ComponentLink1URL: https://wmsc.lcsc.com/wmsc/upload/file/pdf/v2/lcsc/2204010930_TDK-CGA3E2X7R1H104KT0Y0N_C76711.pdf; ComponentLink2Description: JLCPCB Part URL; ComponentLink2URL: https://jlcpcb.com/partdetail/C76711; ComponentLink3Description: LCSC Part URL; ComponentLink3URL: https://lcsc.com/product-detail/Multilayer-Ceramic-Capacitors-MLCC---SMD-SMT_TDK-TDK-CGA3E2X7R1H104KT0Y0N_C76711.html
footprint CAP-0603 (0603 (1608M) Capacitor)
pins: 1, 2

## CGA3E2X7R1H152KT0Y0N
designator C?  Capacitance: 1.5nF  (hidden comment: *)
Capacitor, Ceramic (MLCC), 1.5nF, ±10%, 50V, X7R, ±10%, SMD 0603; Manufacturer: TDK; Manufacturer Part Number: CGA3E2X7R1H152KT0Y0N; Package Size: 0603; JLCPCB Basic Part: No; JLCPCB Part Number: C342916; Supplier 1: LCSC; Category: Capacitors - MLCC; Supplier Part Number 1: C342916; Tolerance: ±10%; Voltage Rating: 50V; Temperature Coefficient: X7R; RoHS: Yes; ComponentLink1Description: Datasheet; ComponentLink1URL: https://wmsc.lcsc.com/wmsc/upload/file/pdf/v2/lcsc/2304140030_TDK-CGA3E2X7R1H152KT0Y0N_C342916.pdf; ComponentLink2Description: JLCPCB Part URL; ComponentLink2URL: https://jlcpcb.com/partdetail/C342916; ComponentLink3Description: LCSC Part URL; ComponentLink3URL: https://lcsc.com/product-detail/Multilayer-Ceramic-Capacitors-MLCC---SMD-SMT_TDK-TDK-CGA3E2X7R1H152KT0Y0N_C342916.html
footprint CAP-0603 (0603 (1608M) Capacitor)
pins: 1, 2

## CGA3E2X7R1H222KT0Y0N
designator C?  Capacitance: 2.2nF  (hidden comment: *)
Capacitor, Ceramic (MLCC), 2.2nF, ±10%, 50V, X7R, ±10%, SMD 0603; Manufacturer: TDK; Manufacturer Part Number: CGA3E2X7R1H222KT0Y0N; Package Size: 0603; JLCPCB Basic Part: No; JLCPCB Part Number: C342902; Supplier 1: LCSC; Category: Capacitors - MLCC; Supplier Part Number 1: C342902; Tolerance: ±10%; Voltage Rating: 50V; Temperature Coefficient: X7R; RoHS: Yes; ComponentLink1Description: Datasheet; ComponentLink1URL: https://wmsc.lcsc.com/wmsc/upload/file/pdf/v2/lcsc/2304140030_TDK-CGA3E2X7R1H222KT0Y0N_C342902.pdf; ComponentLink2Description: JLCPCB Part URL; ComponentLink2URL: https://jlcpcb.com/partdetail/C342902; ComponentLink3Description: LCSC Part URL; ComponentLink3URL: https://lcsc.com/product-detail/Multilayer-Ceramic-Capacitors-MLCC---SMD-SMT_TDK-TDK-CGA3E2X7R1H222KT0Y0N_C342902.html
footprint CAP-0603 (0603 (1608M) Capacitor)
pins: 1, 2

## CGA3E2X7R1H223KT0Y0N
designator C?  Capacitance: 22nF  (hidden comment: *)
Capacitor, Ceramic (MLCC), 22nF, ±10%, 50V, X7R, ±10%, SMD 0603; Manufacturer: TDK; Manufacturer Part Number: CGA3E2X7R1H223KT0Y0N; Package Size: 0603; JLCPCB Basic Part: No; JLCPCB Part Number: C342903; Supplier 1: LCSC; Category: Capacitors - MLCC; Supplier Part Number 1: C342903; Tolerance: ±10%; Voltage Rating: 50V; Temperature Coefficient: X7R; RoHS: Yes; ComponentLink1Description: Datasheet; ComponentLink1URL: https://wmsc.lcsc.com/wmsc/upload/file/pdf/v2/lcsc/2304140030_TDK-CGA3E2X7R1H223KT0Y0N_C342903.pdf; ComponentLink2Description: JLCPCB Part URL; ComponentLink2URL: https://jlcpcb.com/partdetail/C342903; ComponentLink3Description: LCSC Part URL; ComponentLink3URL: https://lcsc.com/product-detail/Multilayer-Ceramic-Capacitors-MLCC---SMD-SMT_TDK-TDK-CGA3E2X7R1H223KT0Y0N_C342903.html
footprint CAP-0603 (0603 (1608M) Capacitor)
pins: 1, 2

## CGA3E2X7R1H332KT0Y0N
designator C?  Capacitance: 3.3nF  (hidden comment: *)
Capacitor, Ceramic (MLCC), 3.3nF, ±10%, 50V, X7R, ±10%, SMD 0603; Manufacturer: TDK; Manufacturer Part Number: CGA3E2X7R1H332KT0Y0N; Package Size: 0603; JLCPCB Basic Part: No; JLCPCB Part Number: C342917; Supplier 1: LCSC; Category: Capacitors - MLCC; Supplier Part Number 1: C342917; Tolerance: ±10%; Voltage Rating: 50V; Temperature Coefficient: X7R; RoHS: Yes; ComponentLink1Description: Datasheet; ComponentLink1URL: https://wmsc.lcsc.com/wmsc/upload/file/pdf/v2/lcsc/2304140030_TDK-CGA3E2X7R1H332KT0Y0N_C342917.pdf; ComponentLink2Description: JLCPCB Part URL; ComponentLink2URL: https://jlcpcb.com/partdetail/C342917; ComponentLink3Description: LCSC Part URL; ComponentLink3URL: https://lcsc.com/product-detail/Multilayer-Ceramic-Capacitors-MLCC---SMD-SMT_TDK-TDK-CGA3E2X7R1H332KT0Y0N_C342917.html
footprint CAP-0603 (0603 (1608M) Capacitor)
pins: 1, 2

## CGA3E2X7R1H333KT0Y0N
designator C?  Capacitance: 33nF  (hidden comment: *)
Capacitor, Ceramic (MLCC), 33nF, ±10%, 50V, X7R, ±10%, SMD 0603; Manufacturer: TDK; Manufacturer Part Number: CGA3E2X7R1H333KT0Y0N; Package Size: 0603; JLCPCB Basic Part: No; JLCPCB Part Number: C342923; Supplier 1: LCSC; Category: Capacitors - MLCC; Supplier Part Number 1: C342923; Tolerance: ±10%; Voltage Rating: 50V; Temperature Coefficient: X7R; RoHS: Yes; ComponentLink1Description: Datasheet; ComponentLink1URL: https://wmsc.lcsc.com/wmsc/upload/file/pdf/v2/lcsc/2304140030_TDK-CGA3E2X7R1H333KT0Y0N_C342923.pdf; ComponentLink2Description: JLCPCB Part URL; ComponentLink2URL: https://jlcpcb.com/partdetail/C342923; ComponentLink3Description: LCSC Part URL; ComponentLink3URL: https://lcsc.com/product-detail/Multilayer-Ceramic-Capacitors-MLCC---SMD-SMT_TDK-TDK-CGA3E2X7R1H333KT0Y0N_C342923.html
footprint CAP-0603 (0603 (1608M) Capacitor)
pins: 1, 2

## CGA3E2X7R1H472KT0Y0N
designator C?  Capacitance: 4.7nF  (hidden comment: *)
Capacitor, Ceramic (MLCC), 4.7nF, ±10%, 50V, X7R, ±10%, SMD 0603; Manufacturer: TDK; Manufacturer Part Number: CGA3E2X7R1H472KT0Y0N; Package Size: 0603; JLCPCB Basic Part: No; JLCPCB Part Number: C156411; Supplier 1: LCSC; Category: Capacitors - MLCC; Supplier Part Number 1: C156411; Tolerance: ±10%; Voltage Rating: 50V; Temperature Coefficient: X7R; RoHS: Yes; ComponentLink1Description: Datasheet; ComponentLink1URL: https://wmsc.lcsc.com/wmsc/upload/file/pdf/v2/lcsc/2304140030_TDK-CGA3E2X7R1H472KT0Y0N_C156411.pdf; ComponentLink2Description: JLCPCB Part URL; ComponentLink2URL: https://jlcpcb.com/partdetail/C156411; ComponentLink3Description: LCSC Part URL; ComponentLink3URL: https://lcsc.com/product-detail/Multilayer-Ceramic-Capacitors-MLCC---SMD-SMT_TDK-TDK-CGA3E2X7R1H472KT0Y0N_C156411.html
footprint CAP-0603 (0603 (1608M) Capacitor)
pins: 1, 2

## CGA3E2X7R1H473KT0Y0N
designator C?  Capacitance: 47nF  (hidden comment: *)
Capacitor, Ceramic (MLCC), 47nF, ±10%, 50V, X7R, ±10%, SMD 0603; Manufacturer: TDK; Manufacturer Part Number: CGA3E2X7R1H473KT0Y0N; Package Size: 0603; JLCPCB Basic Part: No; JLCPCB Part Number: C76712; Supplier 1: LCSC; Category: Capacitors - MLCC; Supplier Part Number 1: C76712; Tolerance: ±10%; Voltage Rating: 50V; Temperature Coefficient: X7R; RoHS: Yes; ComponentLink1Description: Datasheet; ComponentLink1URL: https://wmsc.lcsc.com/wmsc/upload/file/pdf/v2/lcsc/2011111004_TDK-CGA3E2X7R1H473KT0Y0N_C76712.pdf; ComponentLink2Description: JLCPCB Part URL; ComponentLink2URL: https://jlcpcb.com/partdetail/C76712; ComponentLink3Description: LCSC Part URL; ComponentLink3URL: https://lcsc.com/product-detail/Multilayer-Ceramic-Capacitors-MLCC---SMD-SMT_TDK-TDK-CGA3E2X7R1H473KT0Y0N_C76712.html
footprint CAP-0603 (0603 (1608M) Capacitor)
pins: 1, 2

## CGA3E2X7R1H682KT0Y0N
designator C?  Capacitance: 6.8nF  (hidden comment: *)
Capacitor, Ceramic (MLCC), 6.8nF, ±10%, 50V, X7R, ±10%, SMD 0603; Manufacturer: TDK; Manufacturer Part Number: CGA3E2X7R1H682KT0Y0N; Package Size: 0603; JLCPCB Basic Part: No; JLCPCB Part Number: C342918; Supplier 1: LCSC; Category: Capacitors - MLCC; Supplier Part Number 1: C342918; Tolerance: ±10%; Voltage Rating: 50V; Temperature Coefficient: X7R; RoHS: Yes; ComponentLink1Description: Datasheet; ComponentLink1URL: https://wmsc.lcsc.com/wmsc/upload/file/pdf/v2/lcsc/2304140030_TDK-CGA3E2X7R1H682KT0Y0N_C342918.pdf; ComponentLink2Description: JLCPCB Part URL; ComponentLink2URL: https://jlcpcb.com/partdetail/C342918; ComponentLink3Description: LCSC Part URL; ComponentLink3URL: https://lcsc.com/product-detail/Multilayer-Ceramic-Capacitors-MLCC---SMD-SMT_TDK-TDK-CGA3E2X7R1H682KT0Y0N_C342918.html
footprint CAP-0603 (0603 (1608M) Capacitor)
pins: 1, 2

## CGA3E2X7R2A102KT0Y0N
designator C?  Capacitance: 1nF  (hidden comment: *)
Capacitor, Ceramic (MLCC), 1nF, ±10%, 100V, X7R, ±10%, SMD 0603; Manufacturer: TDK; Manufacturer Part Number: CGA3E2X7R2A102KT0Y0N; Package Size: 0603; JLCPCB Basic Part: No; JLCPCB Part Number: C342905; Supplier 1: LCSC; Category: Capacitors - MLCC; Supplier Part Number 1: C342905; Tolerance: ±10%; Voltage Rating: 100V; Temperature Coefficient: X7R; RoHS: Yes; ComponentLink1Description: Datasheet; ComponentLink1URL: https://wmsc.lcsc.com/wmsc/upload/file/pdf/v2/lcsc/2304140030_TDK-CGA3E2X7R2A102KT0Y0N_C342905.pdf; ComponentLink2Description: JLCPCB Part URL; ComponentLink2URL: https://jlcpcb.com/partdetail/C342905; ComponentLink3Description: LCSC Part URL; ComponentLink3URL: https://lcsc.com/product-detail/Multilayer-Ceramic-Capacitors-MLCC---SMD-SMT_TDK-TDK-CGA3E2X7R2A102KT0Y0N_C342905.html
footprint CAP-0603 (0603 (1608M) Capacitor)
pins: 1, 2
